# Altium footprint library FootprintHole.PcbLib: 100 footprints (part 4 of 7)
Each footprint in its own frame and in the unit in brackets; x right, y up, seen from the top. Pads: shape width x height; smd on the part's side, far side on the other; paste and mask are expansions set on the pad; w line width, h text height; cw(c..) or ccw(c..) is an arc to the next point about the centre after c.
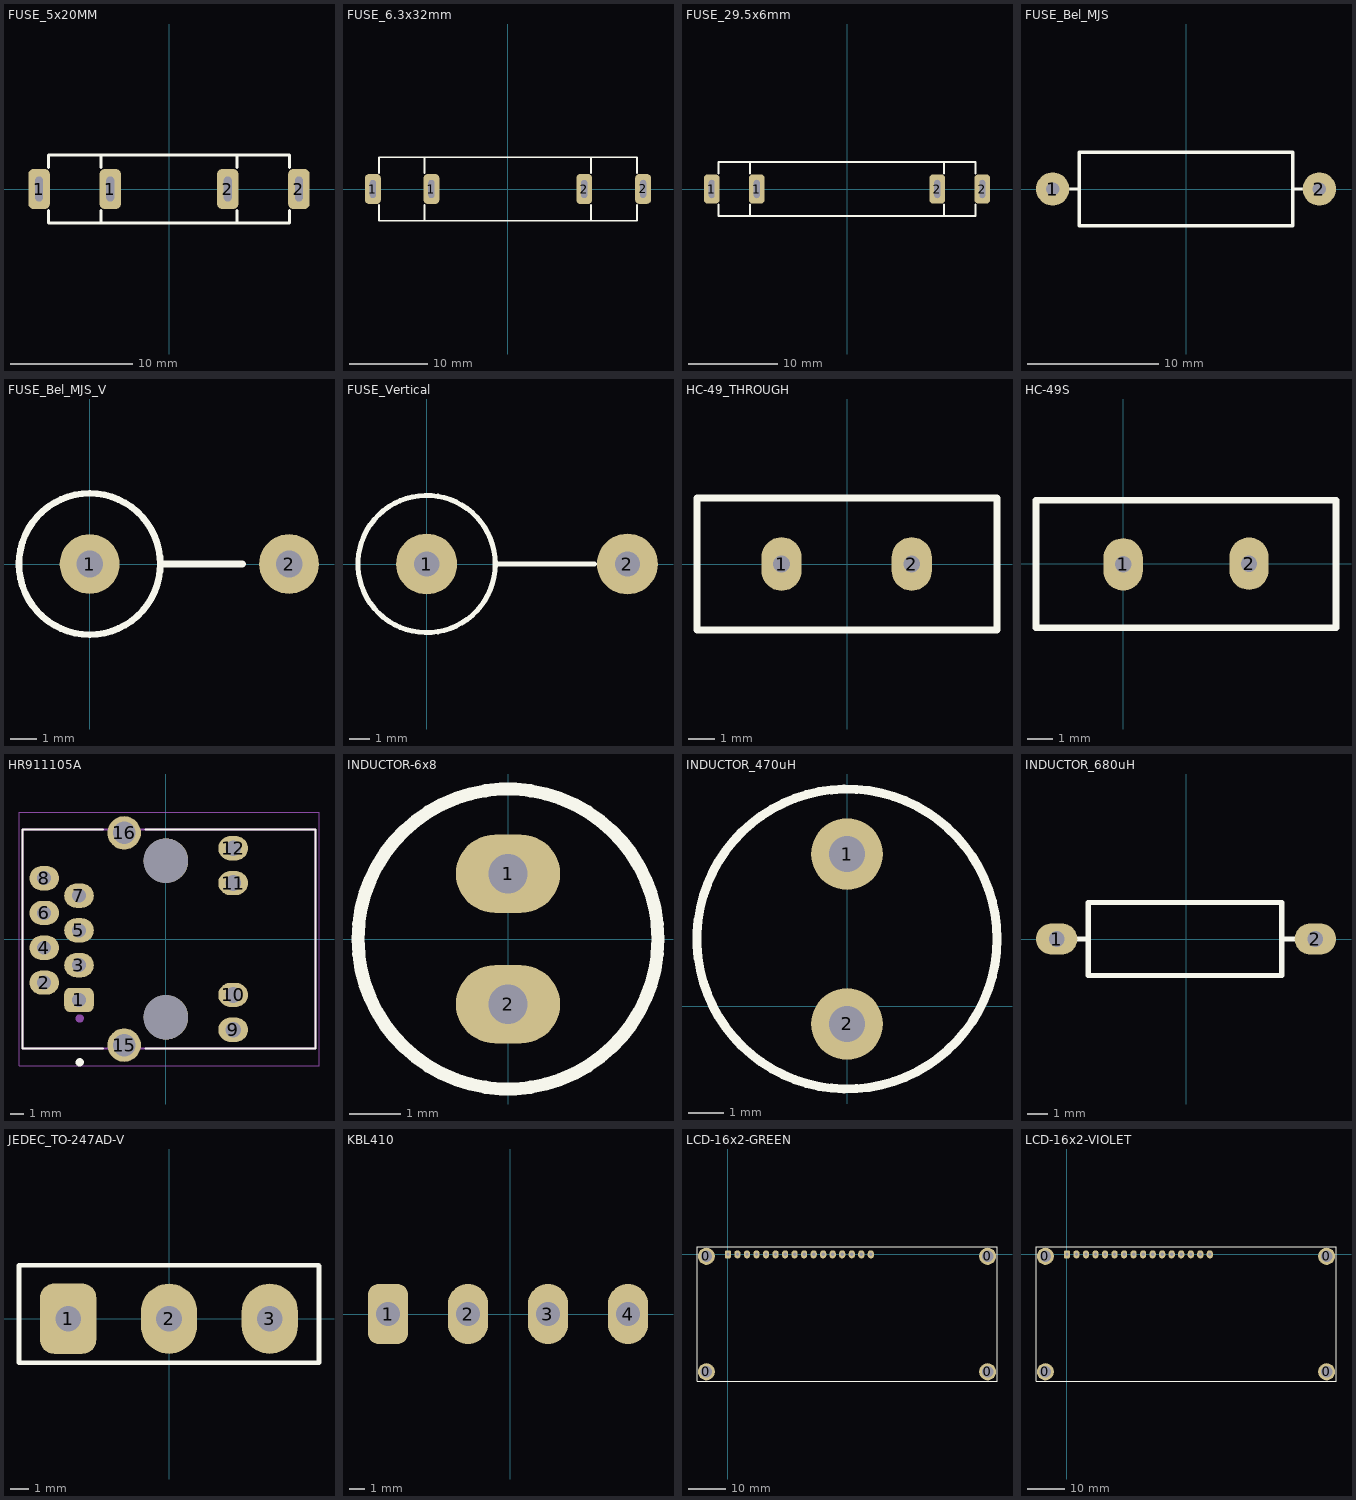
[diagram p3: the footprints below, top view; thin cyan lines are the x and y axes]

## FUSE_5x20MM [mil]
pads (4):
  rrect50% 70x130 hole 80 slot 25 at 0 deg: 1(-420,0) 1(-190,0) 2(190,0) 2(420,0)
Top Overlay:
  lines w10: -390,-70 -390,-110 390,-110 390,-70 ; -390,70 -390,110 390,110 390,70 ; -220,-110 -220,-70 ; -220,70 -220,110 ; 220,-110 220,-70 ; 220,70 220,110
3D body "Fuse Holder.STEP": height 325.12, standoff -137.48, extent -425.2,-114.18 425.2,114.08

## FUSE_6.3x32mm [mil]
pads (4):
  rrect50% 80x150 hole 90 slot 30 at 0 deg: 1(-680,0) 1(-385,0) 2(385,0) 2(681.72,0.45)
Top Overlay:
  lines w10: -650,-80 -650,-160 650,-160 650,-80 ; -650,80 -650,160 650,160 650,80 ; -420,-155.56 -420,-80 ; -420,80 -420,159.72 ; 420,-159.92 420,-80 ; 420,80 420,159.52
3D body "Fuse 6.3x32 and clips LF 102071.stp": height 438.79, standoff -131.73, extent -692.91,-155.43 692.91,155.44

## FUSE_29.5x6mm [mil]
pads (4):
  rrect50% 70x130 hole 80 slot 25 at 0 deg: 1(-600,0) 1(-400,0) 2(400,0) 2(600,0)
Top Overlay:
  lines w10: -570,-70 -570,-120 570,-120 570,-70 ; -570,70 -570,120 570,120 570,70 ; -430.33,70.33 -430.33,120 ; -430,-117.19 -430,-70 ; 430,-119.51 430,-70 ; 430.16,70.16 430.16,120
3D body "Fuse_Holder.STEP": height 368.03, standoff -137.76, extent -607.87,-116.22 607.88,116.24

## FUSE_Bel_MJS [mil]
pads (2):
  round 100 hole 40: 1(-400,0) 2(400,0)
Top Overlay:
  lines w10: -350,0 -320,0 ; 320,0 350,0 ; -320,-110 -320,110 320,110 320,-110 -320,-110
3D body "Bel_MJS.stp": height 228.87, standoff -98.43, extent -416,-110.37 415.88,110.37

## FUSE_Bel_MJS_V [mil]
pads (2):
  round 90 hole 40: 1(0,0) 2(300,0)
Top Overlay:
  circle w10: c0,0 r106.3
  lines w10: 110,0 230,0
3D body "Bel_MJS_V.stp": height 794.92, standoff -98.43, extent -110.5,-110.37 315.88,110.37

## FUSE_Vertical [mil]
pads (2):
  round 120 hole 50: 1(0,0) 2(395,0)
Top Overlay:
  circle w10: c0,0 r135
  lines w10: 135,0 330,0
3D body "Vertical fuse v1.step": height 1565.12, standoff -68.74, extent -137.79,-137.79 413.34,137.8

## HC-49_THROUGH [mil]
pads (2):
  oval 60x80 hole 25: 1(-97.44,0) 2(96.46,0)
Top Overlay:
  lines w10: -223.43,-98.43 -223.43,98.43 223.43,98.43 223.43,-98.43 -223.43,-98.43
3D body "xtalcrystal.SLDPRT": height 144.88, standoff -519.68, extent -223.42,-98.42 223.43,98.43

## HC-49S [mil]
pads (2):
  oval 60x80 hole 25: 1(0,-1) 2(192.13,0)
Top Overlay:
  lines w10: -132.87,-97.44 -132.87,96.46 324.8,96.46 324.8,-97.44 -132.87,-97.44
3D body "SW3dPS-HP49US.STEP": height 137.8, standoff -157.48, extent -127.36,-91.54 319.49,91.53

## HR911105A [mil]
pads (16):
  rrect50% 85x70 hole 40: 1(-250,-175.2)
  oval 85x70 hole 40: 2(-350,-125.2) 3(-250,-75.2) 4(-350,-25.2) 5(-250,24.8) 6(-350,74.8) 7(-250,124.8) 8(-350,174.8)
  oval 85x70 hole 45: 9(192.91,-260.83) 10(192.91,-160.83) 11(192.91,160.83) 12(192.91,260.83)
  round 96.26 hole 64.17: 15(-120.08,-304.92) 16(-120.08,304.92)
  round 127.95 hole 127.95 unplated: ""(0,-225) ""(0,225)
Top Overlay:
  circle w11.81: c-248.03,-354.33 r5.91
  lines w5: -181.1,-314.96 -412.6,-314.96 -412.6,314.96 -181.1,314.96 ; -59.06,-314.96 429.92,-314.96 429.92,314.96 -59.06,314.96
Mechanical 13:
  circle w11.81: c-248.03,-228.35 r5.91
  lines w5: -412.6,-314.96 -412.6,314.96 429.92,314.96 429.92,-314.96 -412.6,-314.96
Mechanical 15:
  lines w1.97: -422.44,-364.17 -422.44,364.17 439.76,364.17 439.76,-364.17 -422.44,-364.17
3D body "User Library-HR911105A.STEP": height 531.5, standoff -118.11, extent -413.39,-312.99 429.13,312.21

## INDUCTOR-6x8 [mil]
pads (2):
  oval 80x60 hole 30: 1(0,50) 2(0,-50)
Top Overlay:
  circle w10: c0,0 r115
3D body "inductor 6x8.STEP": height 317.41, standoff -115.66, extent -117.59,-117.63 118.63,118.59

## INDUCTOR_470uH [mil]
pads (2):
  round 80 hole 40: 1(0,170) 2(0,-20)
Top Overlay:
  circle w10: c0,75 r167.71
3D body "744772101.stp": height 377.95, standoff -192.91, extent -217.14,-142.14 217.14,292.14

## INDUCTOR_680uH [mil]
pads (2):
  oval 80x60 hole 30: 1(-250,0) 2(250,0)
Top Overlay:
  lines w10: -224.41,0 -188.98,0 ; 185.04,0 224.41,0 ; -188.98,-70.87 -188.98,70.87 185.04,70.87 185.04,-70.87 -188.98,-70.87
3D body "RES-0.5W-HH-MF.stp": height 153.54, standoff -185.04, extent -260.82,-70.86 260.83,70.87

## JEDEC_TO-247AD-V [mil]
pads (3):
  rrect50% 120x150 hole 55: 1(-215,0)
  oval 120x150 hole 55: 2(0,0) 3(215,0)
Top Overlay:
  lines w10: -320,-94 -320,114 319,114 320,113 320,-94 -320,-94
3D body "JEDEC_TO-247AD-V.STEP": height 1122.5, standoff -522.5, extent -320,-93.99 320,115

## KBL410 [mil]
pads (4):
  rrect50% 100x150 hole 60: 1(-305,0)
  oval 100x150 hole 60: 2(-105,0) 3(95,0) 4(295,0)
3D body "KBL410.sldprt": height 618.11, standoff -118.11, extent -379.02,-72.68 369.02,173.39

## LCD-16x2-GREEN [mil]
pads (20):
  round 180 hole 118.11: 0(-226.51,-1232.76) 0(-226.3,-20.13) 0(2726.51,-20.18) 0(2726.53,-1232.84)
  rrect50% 65x85 hole 35: 1(0,0)
  oval 65x85 hole 35: 2(100,0) 3(200,0) 4(300,0) 5(400,0) 6(500,0) 7(600,0) 8(700,0) 9(800,0) 10(900,0) 11(1000,0) 12(1100,0) 13(1200,0) 14(1300,0) 15(1400,0) 16(1500,0)
Top Overlay:
  circle w10: c2726.42,-1232.71 r59.06
  circle w10: c-226.34,-1232.71 r59.06
  circle w10: c2726.42,-20.11 r59.06
  circle w10: c-226.34,-20.11 r59.06
  lines w10: -324.76,-1331.14 -324.76,78.31 2824.84,78.31 2824.84,-1331.14 -324.76,-1331.14
3D body "LCD 16X2_green.STEP": height 330.71, standoff -334.65, extent -325,-1330.45 2824.61,79

## LCD-16x2-VIOLET [mil]
pads (20):
  round 180 hole 118.11: 0(-226.51,-1232.76) 0(-226.3,-20.13) 0(2726.51,-20.18) 0(2726.53,-1232.84)
  rrect50% 65x85 hole 35: 1(0,0)
  oval 65x85 hole 35: 2(100,0) 3(200,0) 4(300,0) 5(400,0) 6(500,0) 7(600,0) 8(700,0) 9(800,0) 10(900,0) 11(1000,0) 12(1100,0) 13(1200,0) 14(1300,0) 15(1400,0) 16(1500,0)
Top Overlay:
  circle w10: c-226.34,-20.11 r59.06
  circle w10: c2726.42,-20.11 r59.06
  circle w10: c-226.34,-1232.71 r59.06
  circle w10: c2726.42,-1232.71 r59.06
  lines w10: -324.76,-1331.14 2824.84,-1331.14 2824.84,78.31 -324.76,78.31 -324.76,-1331.14
3D body "LCD 16X2_new.STEP": height 530.71, standoff -134.65, extent -324.21,-1330.92 2825.39,78.52